# Altium footprint library 接插件封装库.PcbLib: 112 footprints (part 2 of 7)
Each footprint in its own frame and in the unit in brackets; x right, y up, seen from the top. Pads: shape width x height; smd on the part's side, far side on the other; paste and mask are expansions set on the pad; w line width, h text height; cw(c..) or ccw(c..) is an arc to the next point about the centre after c.
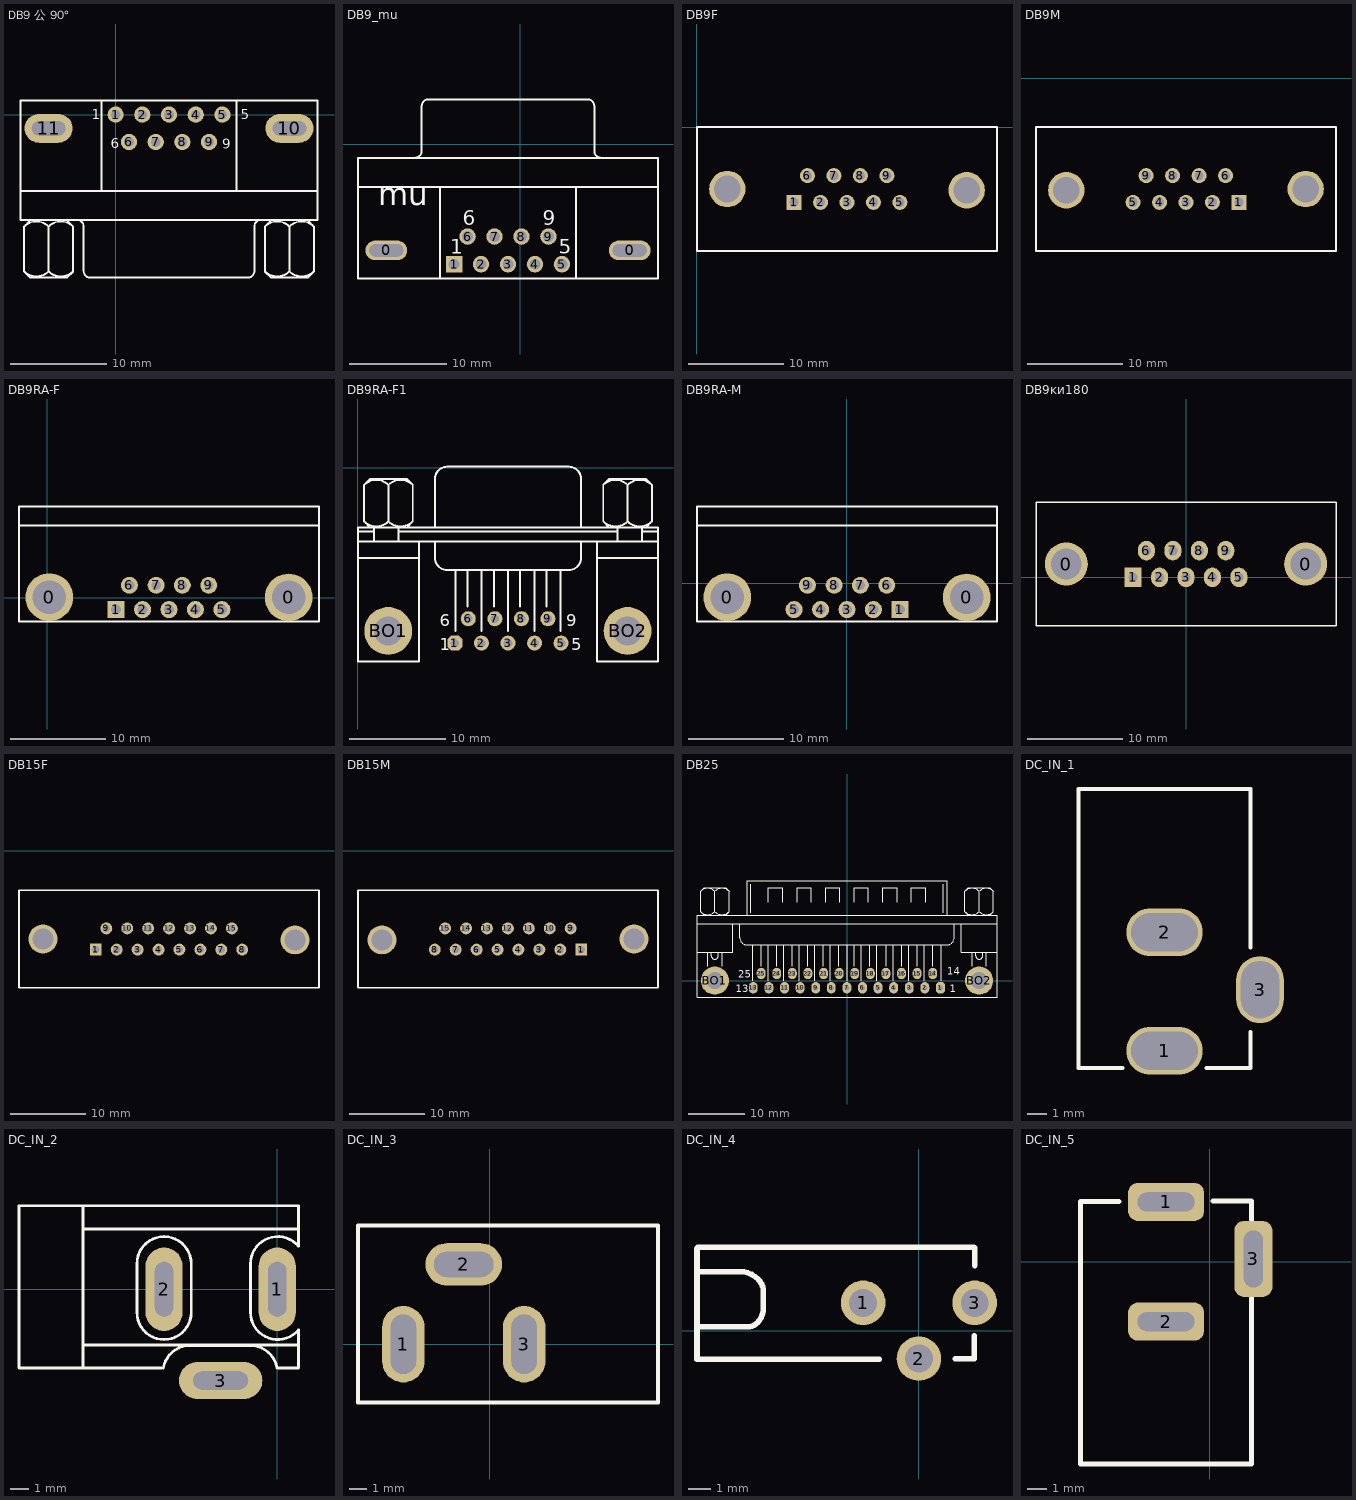
[diagram p1: the footprints below, top view; thin cyan lines are the x and y axes]

## DB9 公 90° [mm]
height 12.5
pads (11):
  round 1.69 hole 1: 1(0,0) 2(2.77,0) 3(5.54,0) 4(8.31,0) 5(11.08,0) 6(1.385,-2.84) 7(4.155,-2.84) 8(6.925,-2.84) 9(9.695,-2.84)
  oval 5x3 hole 1.5 slot 3.5 at 0 deg: 10(18.035,-1.42) 11(-6.955,-1.42)
Top Overlay:
  lines w0.2: -9.86,-7.92 20.94,-7.92 ; -9.502,-16.285 -8.867,-16.92 -5.057,-16.92 -4.422,-16.285 ; -9.502,-16.27 -9.502,-11.619 -8.867,-10.984 ; -9.502,-15.218 -9.502,-15.006 ; -6.962,-16.27 -6.962,-11.619 ; -5.057,-10.984 -4.422,-11.619 -4.422,-16.27 ; -4.02,-10.925 cw(c-4.02,-11.62) -3.325,-11.62 -3.325,-16.22 ; -3.32,-16.225 ccw(c-2.625,-16.225) -2.625,-16.92 13.705,-16.92 ccw(c13.705,-16.225) 14.4,-16.225 ; -1.46,-7.92 -1.46,1.48 ; 12.54,-7.92 12.54,1.48 ; 14.405,-16.22 14.405,-11.62 cw(c15.1,-11.62) 15.1,-10.925 ; 15.498,-16.285 16.133,-16.92 19.943,-16.92 20.578,-16.285 ; 15.498,-16.27 15.498,-11.619 16.133,-10.984 ; 15.498,-15.218 15.498,-15.006 ; 18.038,-16.27 18.038,-11.619 ; 19.943,-10.984 20.578,-11.619 20.578,-16.27 ; -9.86,-10.92 20.94,-10.92 20.94,1.48 -9.86,1.48 -9.86,-10.92
  lines w0.203: -9.504,-11.617 cw(c-8.232,-12.889) -6.96,-11.617 ; -9.502,-16.27 ccw(c-8.23,-14.998) -6.958,-16.27 ; -6.967,-16.27 ccw(c-5.694,-14.998) -4.422,-16.27 ; -6.964,-11.617 cw(c-5.692,-12.889) -4.42,-11.617 ; 15.496,-11.617 cw(c16.768,-12.889) 18.04,-11.617 ; 15.498,-16.27 ccw(c16.77,-14.998) 18.042,-16.27 ; 18.033,-16.27 ccw(c19.306,-14.998) 20.578,-16.27 ; 18.036,-11.617 cw(c19.308,-12.889) 20.58,-11.617
  text "9" at 11.08,-3.55 h1.02
  text "5" at 13,-0.5 h1.02
  text "1" at -2.5,-0.5 h1.02
  text "6" at -0.5,-3.5 h1.02
3D body: height 12.75, standoff -3.65, extent -9.71,-15.945 20.79,1.755

## DB9_mu [mm]
pads (11):
  oval 4.3x2 hole 1.27 slot 3.5 at 0 deg: 0(-13.755,-10.88) 0(11.235,-10.88)
  rect 1.69x1.69 hole 1.09: 1(-6.8,-12.3)
  round 1.69 hole 1.09: 2(-4.03,-12.3) 3(-1.26,-12.3) 4(1.51,-12.3) 5(4.28,-12.3) 6(-5.415,-9.46) 7(-2.645,-9.46) 8(0.125,-9.46) 9(2.895,-9.46)
Top Overlay:
  lines w0.2: -16.66,-4.38 14.14,-4.38 ; -10.82,-1.375 ccw(c-10.82,-0.68) -10.125,-0.68 -10.125,3.92 ; -10.12,3.925 cw(c-9.425,3.925) -9.425,4.62 6.905,4.62 cw(c6.905,3.925) 7.6,3.925 ; -8.26,-13.78 -8.26,-4.38 ; 5.74,-13.78 5.74,-4.38 ; 7.605,3.92 7.605,-0.68 ccw(c8.3,-0.68) 8.3,-1.375 ; -16.66,-13.78 -16.66,-1.38 14.14,-1.38 14.14,-13.78 -16.66,-13.78
  text "mu" at -14.6,-7 h4
  text "1" at -7.18,-11.24 h1.5
  text "5" at 3.94,-11.24 h1.5
  text "9" at 2.33,-8.32 h1.5
  text "6" at -5.9,-8.32 h1.5
3D body: height 12.25, standoff -4.05, extent -16.62,-14.51 14.19,4.69

## DB9F [mil]
pads (11):
  rect 62x62 hole 38: 1(401,-310)
  round 62 hole 38: 2(510,-310) 3(619,-310) 4(728,-310) 5(837,-310) 6(456,-200) 7(565,-200) 8(674,-200) 9(783,-200)
  round 150 hole 110: ""(126,-255) ""(1112,-260)
Top Overlay:
  lines w8: 1,-510 1,0 1237,0 1237,-510 1,-510

## DB9M [mil]
pads (11):
  rect 62x62 hole 38: 1(1038,-512)
  round 62 hole 38: 2(929,-512) 3(820,-512) 4(711,-512) 5(602,-512) 6(983,-402) 7(874,-402) 8(765,-402) 9(656,-402)
  round 150 hole 110: ""(327,-462) ""(1313,-457)
Top Overlay:
  lines w8: 202,-712 202,-202 1438,-202 1438,-712 202,-712

## DB9RA-F [mil]
pads (11):
  round 196.85 hole 137.79: 0(8,2) 0(994,1)
  rect 70x70 hole 40: 1(283,-49)
  round 70 hole 40: 2(392,-49) 3(501,-49) 4(610,-49) 5(719,-49) 6(338,51) 7(448,51) 8(556,51) 9(665,51)
Top Overlay:
  lines w8: -117,297.26 1119,297.26 ; -117,-98.35 1119,-98.35 1119,376 -117,376 -117,-98.35

## DB9RA-F1 [mil]
pads (11):
  oct 62x62 hole 35: 1(400.26,-720.47)
  round 62 hole 35: 2(509.43,-720.47) 3(618.59,-720.47) 4(727.76,-720.47) 5(836.93,-720.47) 6(455.26,-620.47) 7(564.43,-620.47) 8(673.59,-620.47) 9(782.76,-620.47)
  round 196.67 hole 118.33: BO1(126.09,-670.47) BO2(1110.26,-670.47)
Top Overlay:
  lines w8: 1.93,-370.46 251.93,-370.46 ; 1.93,-303.8 1235.26,-303.8 ; 1.93,-262.13 68.59,-262.13 ; 26.84,-220.55 ccw(c76.93,-170.47) 127.01,-220.55 ; 26.84,-70.38 cw(c76.93,-120.47) 127.01,-70.38 ; 51.93,-245.47 26.93,-220.47 26.93,-70.47 51.93,-45.47 201.93,-45.47 226.93,-70.47 226.93,-220.47 201.93,-245.47 ; 68.59,-303.8 68.59,-245.47 ; 126.84,-220.55 ccw(c176.93,-170.47) 227.01,-220.55 ; 126.84,-70.38 cw(c176.93,-120.47) 227.01,-70.38 ; 126.93,-220.47 126.93,-70.47 ; 168.59,-303.8 168.59,-245.47 ; 168.59,-262.13 1068.59,-262.13 ; 251.93,-303.8 251.93,-795.47 1.93,-795.47 1.93,-245.47 1235.26,-245.47 1235.26,-795.47 985.26,-795.47 985.26,-303.8 ; 318.59,-303.8 318.59,-370.46 ccw(c368.59,-370.46) 368.59,-420.46 868.59,-420.46 ccw(c868.59,-370.46) 918.59,-370.46 918.59,-303.8 ; 318.59,-245.47 318.59,-45.47 cw(c368.59,-45.47) 368.59,4.53 868.59,4.54 cw(c868.59,-45.47) 918.59,-45.47 918.59,-245.47 ; 401.93,-670.47 401.93,-420.46 ; 451.93,-570.47 451.93,-420.46 ; 510.26,-670.47 510.26,-420.46 ; 560.26,-570.47 560.26,-420.46 ; 618.59,-670.47 618.59,-420.46 ; 668.59,-570.47 668.59,-420.46 ; 726.93,-670.47 726.93,-420.46 ; 776.93,-570.47 776.93,-420.46 ; 835.26,-670.47 835.26,-420.46 ; 985.26,-370.46 1235.26,-370.46 ; 1010.17,-220.55 ccw(c1060.26,-170.47) 1110.35,-220.55 ; 1010.17,-70.38 cw(c1060.26,-120.47) 1110.35,-70.38 ; 1035.26,-245.47 1010.26,-220.47 1010.26,-70.47 1035.26,-45.47 1185.26,-45.47 1210.26,-70.47 1210.26,-220.47 1185.26,-245.47 ; 1068.59,-303.8 1068.59,-245.47 ; 1110.17,-220.55 ccw(c1160.26,-170.47) 1210.35,-220.55 ; 1110.17,-70.38 cw(c1160.26,-120.47) 1210.35,-70.38 ; 1110.26,-220.47 1110.26,-70.47 ; 1168.59,-303.8 1168.59,-245.47 ; 1168.59,-262.13 1235.26,-262.13
  text "6" at 338.59,-650.47 h50
  text "1" at 338.59,-750.47 h50
  text "5" at 878.59,-750.47 h50
  text "9" at 858.59,-650.47 h50

## DB9RA-M [mil]
pads (11):
  round 196.85 hole 137.79: 0(-492,-58) 0(494,-59)
  rect 70x70 hole 40: 1(219,-109)
  round 70 hole 40: 2(110,-109) 3(1,-109) 4(-108,-109) 5(-217,-109) 6(165,-9) 7(56,-9) 8(-52,-9) 9(-162,-9)
Top Overlay:
  lines w8: -617,237.26 619,237.26 ; -617,-158.35 619,-158.35 619,316 -617,316 -617,-158.35

## DB9ĸͷ180 [mil]
pads (11):
  round 177.17 hole 125.98: 0(-493,55) 0(493,55)
  rect 70x80 hole 38: 1(-218,0)
  oval 70x80 hole 38: 2(-109,0) 3(0,0) 4(109,0) 5(218,0) 6(-163,110) 7(-54,110) 8(55,110) 9(164,110)
Top Overlay:
  lines w6: -618,-200 -618,310 618,310 618,-200 -618,-200

## DB15F [mil]
pads (17):
  rect 62x62 hole 38: 1(607,-515)
  round 62 hole 38: 2(716,-515) 3(825,-515) 4(934,-515) 5(1043,-515) 6(1152,-515) 7(1261,-515) 8(1370,-515) 9(662,-405) 10(771,-405) 11(880,-405) 12(989,-405) 13(1098,-405) 14(1207,-405) 15(1316,-405)
  round 150 hole 110: ""(332,-460) ""(1645,-465)
Top Overlay:
  lines w8: 207,-715 1770,-715 1770,-205 207,-205 207,-715

## DB15M [mil]
pads (17):
  rect 62x62 hole 38: 1(1369,-516)
  round 62 hole 38: 2(1260,-516) 3(1151,-516) 4(1042,-516) 5(933,-516) 6(824,-516) 7(715,-516) 8(606,-516) 9(1314,-406) 10(1205,-406) 11(1096,-406) 12(987,-406) 13(878,-406) 14(769,-406) 15(660,-406)
  round 150 hole 110: ""(331,-466) ""(1644,-461)
Top Overlay:
  lines w8: 206,-716 206,-206 1769,-206 1769,-716 206,-716

## DB25 [mil]
pads (27):
  oct 62x80 hole 35: 1(654.17,-50)
  oval 62x80 hole 35: 2(545,-50) 3(435.83,-50) 4(326.67,-50) 5(217.5,-50) 6(108.33,-50) 7(-0.83,-50) 8(-110,-50) 9(-219.17,-50) 10(-328.33,-50) 11(-437.5,-50) 12(-546.67,-50) 13(-655.83,-50) 14(600,50) 15(490.83,50) 16(381.67,50) 17(272.5,50) 18(163.33,50) 19(54.17,50) 20(-55,50) 21(-164.17,50) 22(-273.33,50) 23(-382.5,50) 24(-491.67,50) 25(-600.83,50)
  round 196.67 hole 118.33: BO1(-925,0) BO2(925,0)
Top Overlay:
  lines w8: -1050,200 -800,200 -800,400 ; -1050,400 1050,400 ; -1025.09,483.25 ccw(c-975,533.33) -924.91,483.25 ; -1025.09,625.09 cw(c-975,575) -924.91,625.09 ; -1000,458.33 -1025,483.33 -1025,625 -1000,650 -850,650 -825,625 -825,483.33 -850,458.33 ; -975,100 -975,200 ; -950,200 -950,175 ccw(c-925,175) -900,175 -900,200 ; -925.09,483.25 ccw(c-875,533.33) -824.91,483.25 ; -925.09,625.09 cw(c-875,575) -824.91,625.09 ; -925,483.33 -925,625 ; -875,100 -875,200 ; -750,400 -750,300 ccw(c-700,300) -700,250 700,250 ccw(c700,300) 750,300 750,400 ; -700,458.33 -700,700 700,700 700,458.33 ; -675,475 -675,675 ; -658.33,0 -658.33,250 ; -600,100 -600,250 ; -550,0 -550,250 ; -550,550 -550,650 -450,650 -450,550 ; -491.67,100 -491.67,250 ; -441.67,0 -441.67,250 ; -383.33,100 -383.33,250 ; -350,550 -350,650 -250,650 -250,550 ; -333.33,0 -333.33,250 ; -275,100 -275,250 ; -225,0 -225,250 ; -166.67,100 -166.67,250 ; -150,550 -150,650 -50,650 -50,550 ; -116.67,0 -116.67,250 ; -58.33,100 -58.33,250 ; 0,0 0,250 ; 50,100 50,250 ; 50,550 50,650 150,650 150,550 ; 100,0 100,250 ; 158.33,100 158.33,250 ; 208.33,0 208.33,250 ; 250,550 250,650 350,650 350,550 ; 275,100 275,250 ; 325,0 325,250 ; 383.33,100 383.33,250 ; 433.33,0 433.33,250 ; 450,550 450,650 550,650 550,550 ; 491.67,100 491.67,250 ; 541.67,0 541.67,250 ; 600,100 600,250 ; 658.33,0 658.33,250 ; 675,475 675,675 ; 800,400 800,200 1050,200 ; 824.91,483.25 ccw(c875,533.33) 925.09,483.25 ; 824.91,625.09 cw(c875,575) 925.09,625.09 ; 850,458.33 825,483.33 825,625 850,650 1000,650 1025,625 1025,483.33 1000,458.33 ; 875,100 875,200 ; 900,200 900,175 ccw(c925,175) 950,175 950,200 ; 924.91,483.25 ccw(c975,533.33) 1025.09,483.25 ; 924.91,625.09 cw(c975,575) 1025.09,625.09 ; 925,483.33 925,625 ; 975,100 975,200 ; -1050,-116.67 1050,-116.67 1050,458.33 -1050,458.33 -1050,-116.67
  text "25" at -760,20 h50
  text "13" at -780,-80 h50
  text "1" at 720,-80 h50
  text "14" at 700,40 h50

## DC_IN_1 [mm]
pads (3):
  oval 4x2.5 hole 2 slot 3.5 at 0 deg: 1(-772.668,-881.745) 2(-772.668,-875.545)
  oval 2.5x3.5 hole 2 slot 3 at 90 deg: 3(-767.668,-878.545)
Top Overlay:
  lines w0.2: -774.868,-882.645 -777.168,-882.645 -777.168,-868.045 -768.168,-868.045 -768.168,-876.345 ; -770.468,-882.645 -768.168,-882.645 -768.168,-880.745

## DC_IN_2 [mil]
pads (3):
  oval 80x180 hole 39.37 slot 118.11 at 90 deg: 1(0,0) 2(-244.09,0)
  oval 180x80 hole 39.37 slot 118.11 at 0 deg: 3(-122.05,-196.85)
Top Overlay:
  lines w6: -419.09,-120 45.91,-120 ; -419.09,130 41.04,130 45.15,130 ; -414.09,180 -434.09,180 -556.89,180 -556.89,-170 -419.09,-170 ; -250.09,-170 -419.09,-170 ; -245.73,-169.84 cw(c-188.09,-180) -188.09,-121.48 -58.09,-121.48 cw(c-58.09,-180) -0.46,-169.84 ; 0.91,-170 45.91,-170 45.91,-90 ; 45.74,-87.62 cw(c0.91,-50) -57.62,-50 -57.62,55 cw(c0.91,55) 45.74,92.62 45.91,180 -419.09,180 -419.09,-170 ; -185.57,55 ccw(c-244.09,55) -302.62,55 -302.62,-50 ccw(c-244.09,-50) -185.57,-50 -185.57,55 ; -185.57,55 -185.57,55
3D body: height 452.76, standoff -118.11, extent -542.56,-195 24.37,171.14

## DC_IN_3 [mm]
pads (3):
  oval 2.5x4.5 hole 1.5 slot 3.5 at 90 deg: 1(-5.08,0) 3(2.032,0)
  oval 4.5x2.5 hole 1.5 slot 3.5 at 0 deg: 2(-1.524,4.699)
Top Overlay:
  lines w0.254: -7.747,-3.429 9.906,-3.429 9.906,6.985 -7.747,6.985 -7.747,-3.429

## DC_IN_4 [mil]
pads (3):
  round 80 hole 50: 1(-100,50) 2(0,-50) 3(100,50)
Top Overlay:
  lines w10: -398,7 -306.9,7 ccw(c-306.9,30.9) -290,14 ccw(c-316.56,40.56) -279,40.56 -279,70.27 ccw(c-309.73,70.27) -288,92 ccw(c-321.8,58.2) -321.8,106 -398,106 ; -71,-51 -398,-51 -398,146.59 cw(c-394.59,146.59) -397,149 cw(c-394.59,146.59) -394.59,150 98.59,150 ; 65,-50 99,-50 ; 99,-46.17 99,-9 ; 100,117 100,148.59

## DC_IN_5 [mm]
pads (3):
  rrect50% 4x2 hole 1 slot 3 at 0 deg: 1(-2.3,3.15) 2(-2.3,-3.15)
  rrect50% 2x4 hole 1 slot 3 at 90 deg: 3(2.3,0.15)
Top Overlay:
  lines w0.254: -4.782,3.168 -6.8,3.168 -6.8,-10.65 2.2,-10.65 2.2,-1.85 ; 0.157,3.193 2.2,3.193 2.2,2.15
3D body: height 11.02, standoff -3.48, extent -6.803,-10.633 2.703,3.193